# Altium schematic symbol library jlcpcb_2025_04_inductors_extended_0402.schlib: 1396 symbols (part 5 of 8) (continued)
## MLG1005S10NJT000
designator L?  Inductance: 10nH
Inductor, 10nH, ±5%, 220mΩ, 500mA, SMD 0402; Manufacturer: TDK; Manufacturer Part Number: MLG1005S10NJT000; Self-Resonant Frequency: 2.5GHz; Q Factor: 8@100MHz; Package Size: 0402; JLCPCB Basic Part: No; JLCPCB Part Number: C95044; Supplier 1: LCSC; Category: Inductors; Supplier Part Number 1: C95044; Tolerance: ±5%; Rated Current: 500mA; DC Resistance: 220mΩ; RoHS: Yes; ComponentLink1Description: Datasheet; ComponentLink1URL: https://wmsc.lcsc.com/wmsc/upload/file/pdf/v2/lcsc/2304140030_TDK-MLG1005S10NJT000_C95044.pdf; ComponentLink2Description: JLCPCB Part URL; ComponentLink2URL: https://jlcpcb.com/partdetail/C95044; ComponentLink3Description: LCSC Part URL; ComponentLink3URL: https://lcsc.com/product-detail/Inductors-SMD_TDK-TDK-MLG1005S10NJT000_C95044.html
footprint IND-0402 (0402 (1005M) Inductor)
pins: 1, 2

## MLG1005S10NJTD25
designator L?  Inductance: 10nH
Inductor, 10nH, ±5%, 220mΩ, 500mA, SMD 0402; Manufacturer: TDK; Manufacturer Part Number: MLG1005S10NJTD25; Self-Resonant Frequency: 3.4GHz; Q Factor: 8@100MHz; Package Size: 0402; JLCPCB Basic Part: No; JLCPCB Part Number: C524460; Supplier 1: LCSC; Category: Inductors; Supplier Part Number 1: C524460; Tolerance: ±5%; Rated Current: 500mA; DC Resistance: 220mΩ; RoHS: Yes; ComponentLink1Description: Datasheet; ComponentLink1URL: https://wmsc.lcsc.com/wmsc/upload/file/pdf/v2/lcsc/2304140030_TDK-MLG1005S10NJTD25_C524460.pdf; ComponentLink2Description: JLCPCB Part URL; ComponentLink2URL: https://jlcpcb.com/partdetail/C524460; ComponentLink3Description: LCSC Part URL; ComponentLink3URL: https://lcsc.com/product-detail/Inductors-SMD_TDK-TDK-MLG1005S10NJTD25_C524460.html
footprint IND-0402 (0402 (1005M) Inductor)
pins: 1, 2

## MLG1005S11NJT000
designator L?  Inductance: 11nH
Inductor, 11nH, ±5%, 280mΩ, 400mA, SMD 0402; Manufacturer: TDK; Manufacturer Part Number: MLG1005S11NJT000; Self-Resonant Frequency: 2.5GHz; Q Factor: 8@100MHz; Package Size: 0402; JLCPCB Basic Part: No; JLCPCB Part Number: C99148; Supplier 1: LCSC; Category: Inductors; Supplier Part Number 1: C99148; Tolerance: ±5%; Rated Current: 400mA; DC Resistance: 280mΩ; RoHS: Yes; ComponentLink1Description: Datasheet; ComponentLink1URL: https://wmsc.lcsc.com/wmsc/upload/file/pdf/v2/lcsc/2304140030_TDK-MLG1005S11NJT000_C99148.pdf; ComponentLink2Description: JLCPCB Part URL; ComponentLink2URL: https://jlcpcb.com/partdetail/C99148; ComponentLink3Description: LCSC Part URL; ComponentLink3URL: https://lcsc.com/product-detail/Inductors-SMD_TDK-TDK-MLG1005S11NJT000_C99148.html
footprint IND-0402 (0402 (1005M) Inductor)
pins: 1, 2

## MLG1005S12NHT000
designator L?  Inductance: 12nH
Inductor, 12nH, ±3%, 250mΩ, 400mA, SMD 0402; Manufacturer: TDK; Manufacturer Part Number: MLG1005S12NHT000; Self-Resonant Frequency: 2.5GHz; Q Factor: 8@100MHz; Package Size: 0402; JLCPCB Basic Part: No; JLCPCB Part Number: C275264; Supplier 1: LCSC; Category: Inductors; Supplier Part Number 1: C275264; Tolerance: ±3%; Rated Current: 400mA; DC Resistance: 250mΩ; RoHS: Yes; ComponentLink1Description: Datasheet; ComponentLink1URL: https://wmsc.lcsc.com/wmsc/upload/file/pdf/v2/lcsc/2304140030_TDK-MLG1005S12NHT000_C275264.pdf; ComponentLink2Description: JLCPCB Part URL; ComponentLink2URL: https://jlcpcb.com/partdetail/C275264; ComponentLink3Description: LCSC Part URL; ComponentLink3URL: https://lcsc.com/product-detail/Inductors-SMD_TDK-TDK-MLG1005S12NHT000_C275264.html
footprint IND-0402 (0402 (1005M) Inductor)
pins: 1, 2

## MLG1005S12NJT000
designator L?  Inductance: 12nH
Inductor, 12nH, ±5%, 250mΩ, 400mA, SMD 0402; Manufacturer: TDK; Manufacturer Part Number: MLG1005S12NJT000; Self-Resonant Frequency: 2.5GHz; Q Factor: 8@100MHz; Package Size: 0402; JLCPCB Basic Part: No; JLCPCB Part Number: C76762; Supplier 1: LCSC; Category: Inductors; Supplier Part Number 1: C76762; Tolerance: ±5%; Rated Current: 400mA; DC Resistance: 250mΩ; RoHS: Yes; ComponentLink1Description: Datasheet; ComponentLink1URL: https://wmsc.lcsc.com/wmsc/upload/file/pdf/v2/lcsc/2304140030_TDK-MLG1005S12NJT000_C76762.pdf; ComponentLink2Description: JLCPCB Part URL; ComponentLink2URL: https://jlcpcb.com/partdetail/C76762; ComponentLink3Description: LCSC Part URL; ComponentLink3URL: https://lcsc.com/product-detail/Inductors-SMD_TDK-TDK-MLG1005S12NJT000_C76762.html
footprint IND-0402 (0402 (1005M) Inductor)
pins: 1, 2

## MLG1005S12NJTD25
designator L?  Inductance: 12nH
Inductor, 12nH, ±5%, 250mΩ, 400mA, SMD 0402; Manufacturer: TDK; Manufacturer Part Number: MLG1005S12NJTD25; Self-Resonant Frequency: 2.5GHz; Q Factor: 8@100MHz; Package Size: 0402; JLCPCB Basic Part: No; JLCPCB Part Number: C433023; Supplier 1: LCSC; Category: Inductors; Supplier Part Number 1: C433023; Tolerance: ±5%; Rated Current: 400mA; DC Resistance: 250mΩ; RoHS: Yes; ComponentLink1Description: Datasheet; ComponentLink1URL: https://wmsc.lcsc.com/wmsc/upload/file/pdf/v2/lcsc/2304140030_TDK-MLG1005S12NJTD25_C433023.pdf; ComponentLink2Description: JLCPCB Part URL; ComponentLink2URL: https://jlcpcb.com/partdetail/C433023; ComponentLink3Description: LCSC Part URL; ComponentLink3URL: https://lcsc.com/product-detail/Inductors-SMD_TDK-TDK-MLG1005S12NJTD25_C433023.html
footprint IND-0402 (0402 (1005M) Inductor)
pins: 1, 2

## MLG1005S13NJT000
designator L?  Inductance: 13nH
Inductor, 13nH, ±5%, 260mΩ, 400mA, SMD 0402; Manufacturer: TDK; Manufacturer Part Number: MLG1005S13NJT000; Self-Resonant Frequency: 2.9GHz; Q Factor: 8@100MHz; Package Size: 0402; JLCPCB Basic Part: No; JLCPCB Part Number: C307720; Supplier 1: LCSC; Category: Inductors; Supplier Part Number 1: C307720; Tolerance: ±5%; Rated Current: 400mA; DC Resistance: 260mΩ; RoHS: Yes; ComponentLink1Description: Datasheet; ComponentLink1URL: https://wmsc.lcsc.com/wmsc/upload/file/pdf/v2/lcsc/1811081628_TDK-MLG1005S13NJT000_C307720.pdf; ComponentLink2Description: JLCPCB Part URL; ComponentLink2URL: https://jlcpcb.com/partdetail/C307720; ComponentLink3Description: LCSC Part URL; ComponentLink3URL: https://lcsc.com/product-detail/Inductors-SMD_TDK-TDK-MLG1005S13NJT000_C307720.html
footprint IND-0402 (0402 (1005M) Inductor)
pins: 1, 2

## MLG1005S15NHT000
designator L?  Inductance: 15nH
Inductor, 15nH, ±3%, 350mΩ, 400mA, SMD 0402; Manufacturer: TDK; Manufacturer Part Number: MLG1005S15NHT000; Self-Resonant Frequency: 2.2GHz; Q Factor: 8@100MHz; Package Size: 0402; JLCPCB Basic Part: No; JLCPCB Part Number: C502013; Supplier 1: LCSC; Category: Inductors; Supplier Part Number 1: C502013; Tolerance: ±3%; Rated Current: 400mA; DC Resistance: 350mΩ; RoHS: Yes; ComponentLink1Description: Datasheet; ComponentLink1URL: https://wmsc.lcsc.com/wmsc/upload/file/pdf/v2/lcsc/2304140030_TDK-MLG1005S15NHT000_C502013.pdf; ComponentLink2Description: JLCPCB Part URL; ComponentLink2URL: https://jlcpcb.com/partdetail/C502013; ComponentLink3Description: LCSC Part URL; ComponentLink3URL: https://lcsc.com/product-detail/Inductors-SMD_TDK-TDK-MLG1005S15NHT000_C502013.html
footprint IND-0402 (0402 (1005M) Inductor)
pins: 1, 2

## MLG1005S15NJT000
designator L?  Inductance: 15nH
Inductor, 15nH, ±5%, 350mΩ, 400mA, SMD 0402; Manufacturer: TDK; Manufacturer Part Number: MLG1005S15NJT000; Self-Resonant Frequency: 2.2GHz; Q Factor: 8@100MHz; Package Size: 0402; JLCPCB Basic Part: No; JLCPCB Part Number: C76763; Supplier 1: LCSC; Category: Inductors; Supplier Part Number 1: C76763; Tolerance: ±5%; Rated Current: 400mA; DC Resistance: 350mΩ; RoHS: Yes; ComponentLink1Description: Datasheet; ComponentLink1URL: https://wmsc.lcsc.com/wmsc/upload/file/pdf/v2/lcsc/2304140030_TDK-MLG1005S15NJT000_C76763.pdf; ComponentLink2Description: JLCPCB Part URL; ComponentLink2URL: https://jlcpcb.com/partdetail/C76763; ComponentLink3Description: LCSC Part URL; ComponentLink3URL: https://lcsc.com/product-detail/Inductors-SMD_TDK-TDK-MLG1005S15NJT000_C76763.html
footprint IND-0402 (0402 (1005M) Inductor)
pins: 1, 2

## MLG1005S15NJTD25
designator L?  Inductance: 15nH
Inductor, 15nH, ±5%, 350mΩ, 400mA, SMD 0402; Manufacturer: TDK; Manufacturer Part Number: MLG1005S15NJTD25; Self-Resonant Frequency: 2.2GHz; Q Factor: 8@100MHz; Package Size: 0402; JLCPCB Basic Part: No; JLCPCB Part Number: C307721; Supplier 1: LCSC; Category: Inductors; Supplier Part Number 1: C307721; Tolerance: ±5%; Rated Current: 400mA; DC Resistance: 350mΩ; RoHS: Yes; ComponentLink1Description: Datasheet; ComponentLink1URL: https://wmsc.lcsc.com/wmsc/upload/file/pdf/v2/lcsc/2304140030_TDK-MLG1005S15NJTD25_C307721.pdf; ComponentLink2Description: JLCPCB Part URL; ComponentLink2URL: https://jlcpcb.com/partdetail/C307721; ComponentLink3Description: LCSC Part URL; ComponentLink3URL: https://lcsc.com/product-detail/Inductors-SMD_TDK-TDK-MLG1005S15NJTD25_C307721.html
footprint IND-0402 (0402 (1005M) Inductor)
pins: 1, 2

## MLG1005S18NHT000
designator L?  Inductance: 18nH
Inductor, 18nH, ±3%, 400mΩ, 350mA, SMD 0402; Manufacturer: TDK; Manufacturer Part Number: MLG1005S18NHT000; Self-Resonant Frequency: 2.5GHz; Q Factor: 8@100MHz; Package Size: 0402; JLCPCB Basic Part: No; JLCPCB Part Number: C880701; Supplier 1: LCSC; Category: Inductors; Supplier Part Number 1: C880701; Tolerance: ±3%; Rated Current: 350mA; DC Resistance: 400mΩ; RoHS: Yes; ComponentLink1Description: Datasheet; ComponentLink1URL: https://wmsc.lcsc.com/wmsc/upload/file/pdf/v2/lcsc/2304140030_TDK-MLG1005S18NHT000_C880701.pdf; ComponentLink2Description: JLCPCB Part URL; ComponentLink2URL: https://jlcpcb.com/partdetail/C880701; ComponentLink3Description: LCSC Part URL; ComponentLink3URL: https://lcsc.com/product-detail/Inductors-SMD_TDK-TDK-MLG1005S18NHT000_C880701.html
footprint IND-0402 (0402 (1005M) Inductor)
pins: 1, 2

## MLG1005S18NJT000
designator L?  Inductance: 18nH
Inductor, 18nH, ±5%, 400mΩ, 350mA, SMD 0402; Manufacturer: TDK; Manufacturer Part Number: MLG1005S18NJT000; Self-Resonant Frequency: 2GHz; Q Factor: 8@100MHz; Package Size: 0402; JLCPCB Basic Part: No; JLCPCB Part Number: C76764; Supplier 1: LCSC; Category: Inductors; Supplier Part Number 1: C76764; Tolerance: ±5%; Rated Current: 350mA; DC Resistance: 400mΩ; RoHS: Yes; ComponentLink1Description: Datasheet; ComponentLink1URL: https://wmsc.lcsc.com/wmsc/upload/file/pdf/v2/lcsc/2304140030_TDK-MLG1005S18NJT000_C76764.pdf; ComponentLink2Description: JLCPCB Part URL; ComponentLink2URL: https://jlcpcb.com/partdetail/C76764; ComponentLink3Description: LCSC Part URL; ComponentLink3URL: https://lcsc.com/product-detail/Inductors-SMD_TDK-TDK-MLG1005S18NJT000_C76764.html
footprint IND-0402 (0402 (1005M) Inductor)
pins: 1, 2

## MLG1005S22NHTD25
designator L?  Inductance: 22nH
Inductor, 22nH, ±3%, 460mΩ, 350mA, SMD 0402; Manufacturer: TDK; Manufacturer Part Number: MLG1005S22NHTD25; Self-Resonant Frequency: 2.2GHz; Q Factor: 8@100MHz; Package Size: 0402; JLCPCB Basic Part: No; JLCPCB Part Number: C404640; Supplier 1: LCSC; Category: Inductors; Supplier Part Number 1: C404640; Tolerance: ±3%; Rated Current: 350mA; DC Resistance: 460mΩ; RoHS: Yes; ComponentLink1Description: Datasheet; ComponentLink1URL: https://wmsc.lcsc.com/wmsc/upload/file/pdf/v2/lcsc/2304140030_TDK-MLG1005S22NHTD25_C404640.pdf; ComponentLink2Description: JLCPCB Part URL; ComponentLink2URL: https://jlcpcb.com/partdetail/C404640; ComponentLink3Description: LCSC Part URL; ComponentLink3URL: https://lcsc.com/product-detail/Inductors-SMD_TDK-TDK-MLG1005S22NHTD25_C404640.html
footprint IND-0402 (0402 (1005M) Inductor)
pins: 1, 2

## MLG1005S22NJT000
designator L?  Inductance: 22nH
Inductor, 22nH, ±5%, 460mΩ, 350mA, SMD 0402; Manufacturer: TDK; Manufacturer Part Number: MLG1005S22NJT000; Self-Resonant Frequency: 2.2GHz; Q Factor: 8@100MHz; Package Size: 0402; JLCPCB Basic Part: No; JLCPCB Part Number: C76768; Supplier 1: LCSC; Category: Inductors; Supplier Part Number 1: C76768; Tolerance: ±5%; Rated Current: 350mA; DC Resistance: 460mΩ; RoHS: Yes; ComponentLink1Description: Datasheet; ComponentLink1URL: https://wmsc.lcsc.com/wmsc/upload/file/pdf/v2/lcsc/2304140030_TDK-MLG1005S22NJT000_C76768.pdf; ComponentLink2Description: JLCPCB Part URL; ComponentLink2URL: https://jlcpcb.com/partdetail/C76768; ComponentLink3Description: LCSC Part URL; ComponentLink3URL: https://lcsc.com/product-detail/Inductors-SMD_TDK-TDK-MLG1005S22NJT000_C76768.html
footprint IND-0402 (0402 (1005M) Inductor)
pins: 1, 2

## MLG1005S24NHT000
designator L?  Inductance: 24nH
Inductor, 24nH, ±3%, 430mΩ, 350mA, SMD 0402; Manufacturer: TDK; Manufacturer Part Number: MLG1005S24NHT000; Self-Resonant Frequency: 2.1GHz; Q Factor: 8@100MHz; Package Size: 0402; JLCPCB Basic Part: No; JLCPCB Part Number: C275275; Supplier 1: LCSC; Category: Inductors; Supplier Part Number 1: C275275; Tolerance: ±3%; Rated Current: 350mA; DC Resistance: 430mΩ; RoHS: Yes; ComponentLink1Description: Datasheet; ComponentLink1URL: https://wmsc.lcsc.com/wmsc/upload/file/pdf/v2/lcsc/2304140030_TDK-MLG1005S24NHT000_C275275.pdf; ComponentLink2Description: JLCPCB Part URL; ComponentLink2URL: https://jlcpcb.com/partdetail/C275275; ComponentLink3Description: LCSC Part URL; ComponentLink3URL: https://lcsc.com/product-detail/Inductors-SMD_TDK-TDK-MLG1005S24NHT000_C275275.html
footprint IND-0402 (0402 (1005M) Inductor)
pins: 1, 2

## MLG1005S24NHTD25
designator L?  Inductance: 24nH
Inductor, 24nH, ±3%, 430mΩ, 350mA, SMD 0402; Manufacturer: TDK; Manufacturer Part Number: MLG1005S24NHTD25; Self-Resonant Frequency: 1.7GHz; Q Factor: 8@100MHz; Package Size: 0402; JLCPCB Basic Part: No; JLCPCB Part Number: C404641; Supplier 1: LCSC; Category: Inductors; Supplier Part Number 1: C404641; Tolerance: ±3%; Rated Current: 350mA; DC Resistance: 430mΩ; RoHS: Yes; ComponentLink1Description: Datasheet; ComponentLink1URL: https://wmsc.lcsc.com/wmsc/upload/file/pdf/v2/lcsc/2304140030_TDK-MLG1005S24NHTD25_C404641.pdf; ComponentLink2Description: JLCPCB Part URL; ComponentLink2URL: https://jlcpcb.com/partdetail/C404641; ComponentLink3Description: LCSC Part URL; ComponentLink3URL: https://lcsc.com/product-detail/Inductors-SMD_TDK-TDK-MLG1005S24NHTD25_C404641.html
footprint IND-0402 (0402 (1005M) Inductor)
pins: 1, 2

## MLG1005S24NJT000
designator L?  Inductance: 24nH
Inductor, 24nH, ±5%, 430mΩ, 350mA, SMD 0402; Manufacturer: TDK; Manufacturer Part Number: MLG1005S24NJT000; Self-Resonant Frequency: 1.7GHz; Q Factor: 8@100MHz; Package Size: 0402; JLCPCB Basic Part: No; JLCPCB Part Number: C516790; Supplier 1: LCSC; Category: Inductors; Supplier Part Number 1: C516790; Tolerance: ±5%; Rated Current: 350mA; DC Resistance: 430mΩ; RoHS: Yes; ComponentLink1Description: Datasheet; ComponentLink1URL: https://wmsc.lcsc.com/wmsc/upload/file/pdf/v2/lcsc/2304140030_TDK-MLG1005S24NJT000_C516790.pdf; ComponentLink2Description: JLCPCB Part URL; ComponentLink2URL: https://jlcpcb.com/partdetail/C516790; ComponentLink3Description: LCSC Part URL; ComponentLink3URL: https://lcsc.com/product-detail/Inductors-SMD_TDK-TDK-MLG1005S24NJT000_C516790.html
footprint IND-0402 (0402 (1005M) Inductor)
pins: 1, 2

## MLG1005S27NHT000
designator L?  Inductance: 27nH
Inductor, 27nH, ±3%, 530mΩ, 300mA, SMD 0402; Manufacturer: TDK; Manufacturer Part Number: MLG1005S27NHT000; Self-Resonant Frequency: 2GHz; Q Factor: 8@100MHz; Package Size: 0402; JLCPCB Basic Part: No; JLCPCB Part Number: C275278; Supplier 1: LCSC; Category: Inductors; Supplier Part Number 1: C275278; Tolerance: ±3%; Rated Current: 300mA; DC Resistance: 530mΩ; RoHS: Yes; ComponentLink1Description: Datasheet; ComponentLink1URL: https://wmsc.lcsc.com/wmsc/upload/file/pdf/v2/lcsc/2304140030_TDK-MLG1005S27NHT000_C275278.pdf; ComponentLink2Description: JLCPCB Part URL; ComponentLink2URL: https://jlcpcb.com/partdetail/C275278; ComponentLink3Description: LCSC Part URL; ComponentLink3URL: https://lcsc.com/product-detail/Inductors-SMD_TDK-TDK-MLG1005S27NHT000_C275278.html
footprint IND-0402 (0402 (1005M) Inductor)
pins: 1, 2

## MLG1005S27NJT000
designator L?  Inductance: 27nH
Inductor, 27nH, ±5%, 530mΩ, 300mA, SMD 0402; Manufacturer: TDK; Manufacturer Part Number: MLG1005S27NJT000; Self-Resonant Frequency: 1.6GHz; Q Factor: 8@100MHz; Package Size: 0402; JLCPCB Basic Part: No; JLCPCB Part Number: C98759; Supplier 1: LCSC; Category: Inductors; Supplier Part Number 1: C98759; Tolerance: ±5%; Rated Current: 300mA; DC Resistance: 530mΩ; RoHS: Yes; ComponentLink1Description: Datasheet; ComponentLink1URL: https://wmsc.lcsc.com/wmsc/upload/file/pdf/v2/lcsc/2304140030_TDK-MLG1005S27NJT000_C98759.pdf; ComponentLink2Description: JLCPCB Part URL; ComponentLink2URL: https://jlcpcb.com/partdetail/C98759; ComponentLink3Description: LCSC Part URL; ComponentLink3URL: https://lcsc.com/product-detail/Inductors-SMD_TDK-TDK-MLG1005S27NJT000_C98759.html
footprint IND-0402 (0402 (1005M) Inductor)
pins: 1, 2

## MLG1005S30NJT000
designator L?  Inductance: 30nH
Inductor, 30nH, ±5%, 500mΩ, 300mA, SMD 0402; Manufacturer: TDK; Manufacturer Part Number: MLG1005S30NJT000; Self-Resonant Frequency: 1.9GHz; Q Factor: 8@100MHz; Package Size: 0402; JLCPCB Basic Part: No; JLCPCB Part Number: C76771; Supplier 1: LCSC; Category: Inductors; Supplier Part Number 1: C76771; Tolerance: ±5%; Rated Current: 300mA; DC Resistance: 500mΩ; RoHS: Yes; ComponentLink1Description: Datasheet; ComponentLink1URL: https://wmsc.lcsc.com/wmsc/upload/file/pdf/v2/lcsc/2304140030_TDK-MLG1005S30NJT000_C76771.pdf; ComponentLink2Description: JLCPCB Part URL; ComponentLink2URL: https://jlcpcb.com/partdetail/C76771; ComponentLink3Description: LCSC Part URL; ComponentLink3URL: https://lcsc.com/product-detail/Inductors-SMD_TDK-TDK-MLG1005S30NJT000_C76771.html
footprint IND-0402 (0402 (1005M) Inductor)
pins: 1, 2

## MLG1005S33NHTD25
designator L?  Inductance: 33nH
Inductor, 33nH, ±3%, 590mΩ, 300mA, SMD 0402; Manufacturer: TDK; Manufacturer Part Number: MLG1005S33NHTD25; Self-Resonant Frequency: 1.8GHz; Q Factor: 8@100MHz; Package Size: 0402; JLCPCB Basic Part: No; JLCPCB Part Number: C404644; Supplier 1: LCSC; Category: Inductors; Supplier Part Number 1: C404644; Tolerance: ±3%; Rated Current: 300mA; DC Resistance: 590mΩ; RoHS: Yes; ComponentLink1Description: Datasheet; ComponentLink1URL: https://wmsc.lcsc.com/wmsc/upload/file/pdf/v2/lcsc/2304140030_TDK-MLG1005S33NHTD25_C404644.pdf; ComponentLink2Description: JLCPCB Part URL; ComponentLink2URL: https://jlcpcb.com/partdetail/C404644; ComponentLink3Description: LCSC Part URL; ComponentLink3URL: https://lcsc.com/product-detail/Inductors-SMD_TDK-TDK-MLG1005S33NHTD25_C404644.html
footprint IND-0402 (0402 (1005M) Inductor)
pins: 1, 2

## MLG1005S33NJT000
designator L?  Inductance: 33nH
Inductor, 33nH, ±5%, 590mΩ, 300mA, SMD 0402; Manufacturer: TDK; Manufacturer Part Number: MLG1005S33NJT000; Self-Resonant Frequency: 1.4GHz; Q Factor: 8@100MHz; Package Size: 0402; JLCPCB Basic Part: No; JLCPCB Part Number: C76772; Supplier 1: LCSC; Category: Inductors; Supplier Part Number 1: C76772; Tolerance: ±5%; Rated Current: 300mA; DC Resistance: 590mΩ; RoHS: Yes; ComponentLink1Description: Datasheet; ComponentLink1URL: https://wmsc.lcsc.com/wmsc/upload/file/pdf/v2/lcsc/2304140030_TDK-MLG1005S33NJT000_C76772.pdf; ComponentLink2Description: JLCPCB Part URL; ComponentLink2URL: https://jlcpcb.com/partdetail/C76772; ComponentLink3Description: LCSC Part URL; ComponentLink3URL: https://lcsc.com/product-detail/Inductors-SMD_TDK-TDK-MLG1005S33NJT000_C76772.html
footprint IND-0402 (0402 (1005M) Inductor)
pins: 1, 2

## MLG1005S33NJTD25
designator L?  Inductance: 33nH
Inductor, 33nH, ±5%, 590mΩ, 300mA, SMD 0402; Manufacturer: TDK; Manufacturer Part Number: MLG1005S33NJTD25; Self-Resonant Frequency: 1.4GHz; Q Factor: 8@100MHz; Package Size: 0402; JLCPCB Basic Part: No; JLCPCB Part Number: C2042247; Supplier 1: LCSC; Category: Inductors; Supplier Part Number 1: C2042247; Tolerance: ±5%; Rated Current: 300mA; DC Resistance: 590mΩ; RoHS: Yes; ComponentLink1Description: Datasheet; ComponentLink1URL: https://wmsc.lcsc.com/wmsc/upload/file/pdf/v2/lcsc/2304140030_TDK-MLG1005S33NJTD25_C2042247.pdf; ComponentLink2Description: JLCPCB Part URL; ComponentLink2URL: https://jlcpcb.com/partdetail/C2042247; ComponentLink3Description: LCSC Part URL; ComponentLink3URL: https://lcsc.com/product-detail/Inductors-SMD_TDK-TDK-MLG1005S33NJTD25_C2042247.html
footprint IND-0402 (0402 (1005M) Inductor)
pins: 1, 2

## MLG1005S36NJT000
designator L?  Inductance: 36nH
Inductor, 36nH, ±5%, 620mΩ, 250mA, SMD 0402; Manufacturer: TDK; Manufacturer Part Number: MLG1005S36NJT000; Self-Resonant Frequency: 1.7GHz; Q Factor: 8@100MHz; Package Size: 0402; JLCPCB Basic Part: No; JLCPCB Part Number: C518884; Supplier 1: LCSC; Category: Inductors; Supplier Part Number 1: C518884; Tolerance: ±5%; Rated Current: 250mA; DC Resistance: 620mΩ; RoHS: Yes; ComponentLink1Description: Datasheet; ComponentLink1URL: https://wmsc.lcsc.com/wmsc/upload/file/pdf/v2/lcsc/2005112103_TDK-MLG1005S36NJT000_C518884.pdf; ComponentLink2Description: JLCPCB Part URL; ComponentLink2URL: https://jlcpcb.com/partdetail/C518884; ComponentLink3Description: LCSC Part URL; ComponentLink3URL: https://lcsc.com/product-detail/Inductors-SMD_TDK-TDK-MLG1005S36NJT000_C518884.html
footprint IND-0402 (0402 (1005M) Inductor)
pins: 1, 2

## MLG1005S36NJTD25
designator L?  Inductance: 36nH
Inductor, 36nH, ±5%, 620mΩ, 250mA, SMD 0402; Manufacturer: TDK; Manufacturer Part Number: MLG1005S36NJTD25; Self-Resonant Frequency: 1.3GHz; Q Factor: 8@100MHz; Package Size: 0402; JLCPCB Basic Part: No; JLCPCB Part Number: C2046147; Supplier 1: LCSC; Category: Inductors; Supplier Part Number 1: C2046147; Tolerance: ±5%; Rated Current: 250mA; DC Resistance: 620mΩ; RoHS: Yes; ComponentLink1Description: Datasheet; ComponentLink1URL: https://wmsc.lcsc.com/wmsc/upload/file/pdf/v2/lcsc/2304140030_TDK-MLG1005S36NJTD25_C2046147.pdf; ComponentLink2Description: JLCPCB Part URL; ComponentLink2URL: https://jlcpcb.com/partdetail/C2046147; ComponentLink3Description: LCSC Part URL; ComponentLink3URL: https://lcsc.com/product-detail/Inductors-SMD_TDK-TDK-MLG1005S36NJTD25_C2046147.html
footprint IND-0402 (0402 (1005M) Inductor)
pins: 1, 2

## MLG1005S39NJT000
designator L?  Inductance: 39nH
Inductor, 39nH, ±5%, 650mΩ, 250mA, SMD 0402; Manufacturer: TDK; Manufacturer Part Number: MLG1005S39NJT000; Self-Resonant Frequency: 1.2GHz; Q Factor: 8@100MHz; Package Size: 0402; JLCPCB Basic Part: No; JLCPCB Part Number: C87531; Supplier 1: LCSC; Category: Inductors; Supplier Part Number 1: C87531; Tolerance: ±5%; Rated Current: 250mA; DC Resistance: 650mΩ; RoHS: Yes; ComponentLink1Description: Datasheet; ComponentLink1URL: https://wmsc.lcsc.com/wmsc/upload/file/pdf/v2/lcsc/2304140030_TDK-MLG1005S39NJT000_C87531.pdf; ComponentLink2Description: JLCPCB Part URL; ComponentLink2URL: https://jlcpcb.com/partdetail/C87531; ComponentLink3Description: LCSC Part URL; ComponentLink3URL: https://lcsc.com/product-detail/Inductors-SMD_TDK-TDK-MLG1005S39NJT000_C87531.html
footprint IND-0402 (0402 (1005M) Inductor)
pins: 1, 2

## MLG1005S39NJTD25
designator L?  Inductance: 39nH
Inductor, 39nH, ±5%, 650mΩ, 250mA, SMD 0402; Manufacturer: TDK; Manufacturer Part Number: MLG1005S39NJTD25; Self-Resonant Frequency: 1.2GHz; Q Factor: 8@100MHz; Package Size: 0402; JLCPCB Basic Part: No; JLCPCB Part Number: C307725; Supplier 1: LCSC; Category: Inductors; Supplier Part Number 1: C307725; Tolerance: ±5%; Rated Current: 250mA; DC Resistance: 650mΩ; RoHS: Yes; ComponentLink1Description: Datasheet; ComponentLink1URL: https://wmsc.lcsc.com/wmsc/upload/file/pdf/v2/lcsc/2304140030_TDK-MLG1005S39NJTD25_C307725.pdf; ComponentLink2Description: JLCPCB Part URL; ComponentLink2URL: https://jlcpcb.com/partdetail/C307725; ComponentLink3Description: LCSC Part URL; ComponentLink3URL: https://lcsc.com/product-detail/Inductors-SMD_TDK-TDK-MLG1005S39NJTD25_C307725.html
footprint IND-0402 (0402 (1005M) Inductor)
pins: 1, 2

## MLG1005S43NJTD25
designator L?  Inductance: 43nH
Inductor, 43nH, ±5%, 670mΩ, 250mA, SMD 0402; Manufacturer: TDK; Manufacturer Part Number: MLG1005S43NJTD25; Self-Resonant Frequency: 1.6GHz; Q Factor: 8@100MHz; Package Size: 0402; JLCPCB Basic Part: No; JLCPCB Part Number: C2042359; Supplier 1: LCSC; Category: Inductors; Supplier Part Number 1: C2042359; Tolerance: ±5%; Rated Current: 250mA; DC Resistance: 670mΩ; RoHS: Yes; ComponentLink1Description: Datasheet; ComponentLink1URL: https://wmsc.lcsc.com/wmsc/upload/file/pdf/v2/lcsc/2304140030_TDK-MLG1005S43NJTD25_C2042359.pdf; ComponentLink2Description: JLCPCB Part URL; ComponentLink2URL: https://jlcpcb.com/partdetail/C2042359; ComponentLink3Description: LCSC Part URL; ComponentLink3URL: https://lcsc.com/product-detail/Inductors-SMD_TDK-TDK-MLG1005S43NJTD25_C2042359.html
footprint IND-0402 (0402 (1005M) Inductor)
pins: 1, 2

## MLG1005S47NJT000
designator L?  Inductance: 47nH
Inductor, 47nH, ±5%, 750mΩ, 250mA, SMD 0402; Manufacturer: TDK; Manufacturer Part Number: MLG1005S47NJT000; Self-Resonant Frequency: 1.1GHz; Q Factor: 8@100MHz; Package Size: 0402; JLCPCB Basic Part: No; JLCPCB Part Number: C76776; Supplier 1: LCSC; Category: Inductors; Supplier Part Number 1: C76776; Tolerance: ±5%; Rated Current: 250mA; DC Resistance: 750mΩ; RoHS: Yes; ComponentLink1Description: Datasheet; ComponentLink1URL: https://wmsc.lcsc.com/wmsc/upload/file/pdf/v2/lcsc/2304140030_TDK-MLG1005S47NJT000_C76776.pdf; ComponentLink2Description: JLCPCB Part URL; ComponentLink2URL: https://jlcpcb.com/partdetail/C76776; ComponentLink3Description: LCSC Part URL; ComponentLink3URL: https://lcsc.com/product-detail/Inductors-SMD_TDK-TDK-MLG1005S47NJT000_C76776.html
footprint IND-0402 (0402 (1005M) Inductor)
pins: 1, 2

## MLG1005S47NJTD25
designator L?  Inductance: 47nH
Inductor, 47nH, ±5%, 750mΩ, 250mA, SMD 0402; Manufacturer: TDK; Manufacturer Part Number: MLG1005S47NJTD25; Self-Resonant Frequency: 1.1GHz; Q Factor: 8@100MHz; Package Size: 0402; JLCPCB Basic Part: No; JLCPCB Part Number: C307727; Supplier 1: LCSC; Category: Inductors; Supplier Part Number 1: C307727; Tolerance: ±5%; Rated Current: 250mA; DC Resistance: 750mΩ; RoHS: Yes; ComponentLink1Description: Datasheet; ComponentLink1URL: https://wmsc.lcsc.com/wmsc/upload/file/pdf/v2/lcsc/2304140030_TDK-MLG1005S47NJTD25_C307727.pdf; ComponentLink2Description: JLCPCB Part URL; ComponentLink2URL: https://jlcpcb.com/partdetail/C307727; ComponentLink3Description: LCSC Part URL; ComponentLink3URL: https://lcsc.com/product-detail/Inductors-SMD_TDK-TDK-MLG1005S47NJTD25_C307727.html
footprint IND-0402 (0402 (1005M) Inductor)
pins: 1, 2

## MLG1005S51NJTD25
designator L?  Inductance: 51nH
Inductor, 51nH, ±5%, 720mΩ, 250mA, SMD 0402; Manufacturer: TDK; Manufacturer Part Number: MLG1005S51NJTD25; Self-Resonant Frequency: 1.5GHz; Q Factor: 8@100MHz; Package Size: 0402; JLCPCB Basic Part: No; JLCPCB Part Number: C1329469; Supplier 1: LCSC; Category: Inductors; Supplier Part Number 1: C1329469; Tolerance: ±5%; Rated Current: 250mA; DC Resistance: 720mΩ; RoHS: Yes; ComponentLink1Description: Datasheet; ComponentLink1URL: https://wmsc.lcsc.com/wmsc/upload/file/pdf/v2/lcsc/2304140030_TDK-MLG1005S51NJTD25_C1329469.pdf; ComponentLink2Description: JLCPCB Part URL; ComponentLink2URL: https://jlcpcb.com/partdetail/C1329469; ComponentLink3Description: LCSC Part URL; ComponentLink3URL: https://lcsc.com/product-detail/Inductors-SMD_TDK-TDK-MLG1005S51NJTD25_C1329469.html
footprint IND-0402 (0402 (1005M) Inductor)
pins: 1, 2

## MLG1005S56NJT000
designator L?  Inductance: 56nH
Inductor, 56nH, ±5%, 830mΩ, 200mA, SMD 0402; Manufacturer: TDK; Manufacturer Part Number: MLG1005S56NJT000; Self-Resonant Frequency: 1GHz; Q Factor: 8@100MHz; Package Size: 0402; JLCPCB Basic Part: No; JLCPCB Part Number: C76777; Supplier 1: LCSC; Category: Inductors; Supplier Part Number 1: C76777; Tolerance: ±5%; Rated Current: 200mA; DC Resistance: 830mΩ; RoHS: Yes; ComponentLink1Description: Datasheet; ComponentLink1URL: https://wmsc.lcsc.com/wmsc/upload/file/pdf/v2/lcsc/2304140030_TDK-MLG1005S56NJT000_C76777.pdf; ComponentLink2Description: JLCPCB Part URL; ComponentLink2URL: https://jlcpcb.com/partdetail/C76777; ComponentLink3Description: LCSC Part URL; ComponentLink3URL: https://lcsc.com/product-detail/Inductors-SMD_TDK-TDK-MLG1005S56NJT000_C76777.html
footprint IND-0402 (0402 (1005M) Inductor)
pins: 1, 2

## MLG1005S68NHTD25
designator L?  Inductance: 68nH
Inductor, 68nH, ±3%, 870mΩ, 200mA, SMD 0402; Manufacturer: TDK; Manufacturer Part Number: MLG1005S68NHTD25; Self-Resonant Frequency: 1.1GHz; Q Factor: 8@100MHz; Package Size: 0402; JLCPCB Basic Part: No; JLCPCB Part Number: C404652; Supplier 1: LCSC; Category: Inductors; Supplier Part Number 1: C404652; Tolerance: ±3%; Rated Current: 200mA; DC Resistance: 870mΩ; RoHS: Yes; ComponentLink1Description: Datasheet; ComponentLink1URL: https://wmsc.lcsc.com/wmsc/upload/file/pdf/v2/lcsc/2304140030_TDK-MLG1005S68NHTD25_C404652.pdf; ComponentLink2Description: JLCPCB Part URL; ComponentLink2URL: https://jlcpcb.com/partdetail/C404652; ComponentLink3Description: LCSC Part URL; ComponentLink3URL: https://lcsc.com/product-detail/Inductors-SMD_TDK-TDK-MLG1005S68NHTD25_C404652.html
footprint IND-0402 (0402 (1005M) Inductor)
pins: 1, 2

## MLG1005S68NJT000
designator L?  Inductance: 68nH
Inductor, 68nH, ±5%, 870mΩ, 200mA, SMD 0402; Manufacturer: TDK; Manufacturer Part Number: MLG1005S68NJT000; Self-Resonant Frequency: 800MHz; Q Factor: 8@100MHz; Package Size: 0402; JLCPCB Basic Part: No; JLCPCB Part Number: C87533; Supplier 1: LCSC; Category: Inductors; Supplier Part Number 1: C87533; Tolerance: ±5%; Rated Current: 200mA; DC Resistance: 870mΩ; RoHS: Yes; ComponentLink1Description: Datasheet; ComponentLink1URL: https://wmsc.lcsc.com/wmsc/upload/file/pdf/v2/lcsc/2304140030_TDK-MLG1005S68NJT000_C87533.pdf; ComponentLink2Description: JLCPCB Part URL; ComponentLink2URL: https://jlcpcb.com/partdetail/C87533; ComponentLink3Description: LCSC Part URL; ComponentLink3URL: https://lcsc.com/product-detail/Inductors-SMD_TDK-TDK-MLG1005S68NJT000_C87533.html
footprint IND-0402 (0402 (1005M) Inductor)
pins: 1, 2

## MLG1005S75NHTD25
designator L?  Inductance: 75nH
Inductor, 75nH, ±3%, 930mΩ, 200mA, SMD 0402; Manufacturer: TDK; Manufacturer Part Number: MLG1005S75NHTD25; Self-Resonant Frequency: 1.1GHz; Q Factor: 8@100MHz; Package Size: 0402; JLCPCB Basic Part: No; JLCPCB Part Number: C404653; Supplier 1: LCSC; Category: Inductors; Supplier Part Number 1: C404653; Tolerance: ±3%; Rated Current: 200mA; DC Resistance: 930mΩ; RoHS: Yes; ComponentLink1Description: Datasheet; ComponentLink1URL: https://wmsc.lcsc.com/wmsc/upload/file/pdf/v2/lcsc/2304140030_TDK-MLG1005S75NHTD25_C404653.pdf; ComponentLink2Description: JLCPCB Part URL; ComponentLink2URL: https://jlcpcb.com/partdetail/C404653; ComponentLink3Description: LCSC Part URL; ComponentLink3URL: https://lcsc.com/product-detail/Inductors-SMD_TDK-TDK-MLG1005S75NHTD25_C404653.html
footprint IND-0402 (0402 (1005M) Inductor)
pins: 1, 2

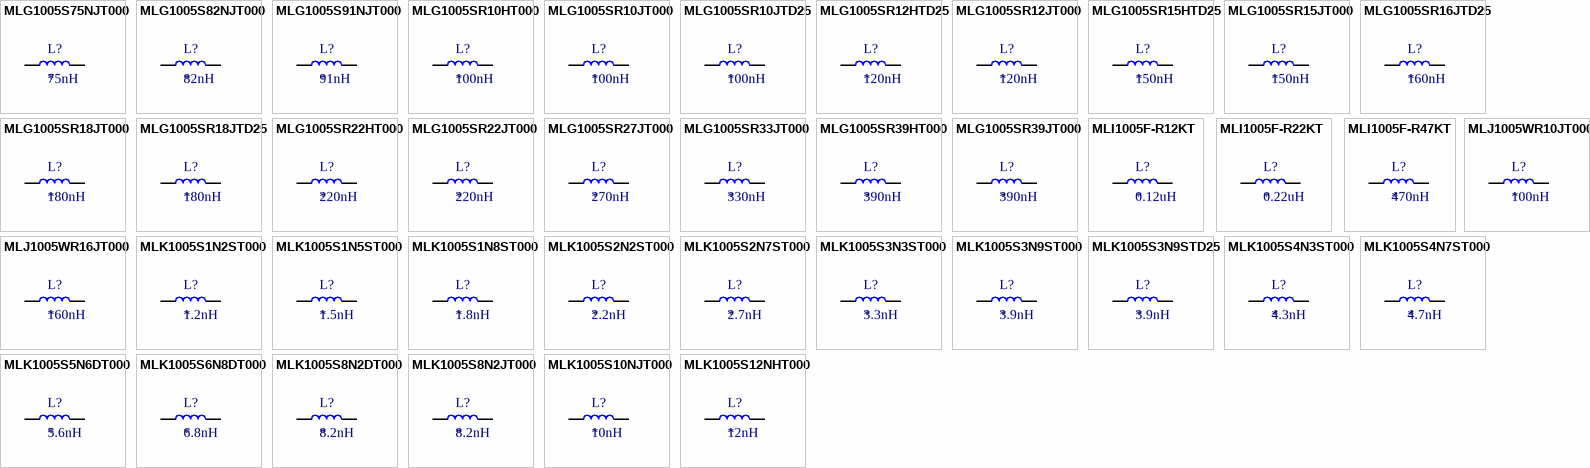
[diagram p22: symbols MLG1005S75NJT000 to MLK1005S12NHT000]

## MLG1005S75NJT000
designator L?  Inductance: 75nH
Inductor, 75nH, ±5%, 930mΩ, 200mA, SMD 0402; Manufacturer: TDK; Manufacturer Part Number: MLG1005S75NJT000; Self-Resonant Frequency: 750MHz; Q Factor: 8@100MHz; Package Size: 0402; JLCPCB Basic Part: No; JLCPCB Part Number: C880710; Supplier 1: LCSC; Category: Inductors; Supplier Part Number 1: C880710; Tolerance: ±5%; Rated Current: 200mA; DC Resistance: 930mΩ; RoHS: Yes; ComponentLink1Description: Datasheet; ComponentLink1URL: https://wmsc.lcsc.com/wmsc/upload/file/pdf/v2/lcsc/2010170835_TDK-MLG1005S75NJT000_C880710.pdf; ComponentLink2Description: JLCPCB Part URL; ComponentLink2URL: https://jlcpcb.com/partdetail/C880710; ComponentLink3Description: LCSC Part URL; ComponentLink3URL: https://lcsc.com/product-detail/Inductors-SMD_TDK-TDK-MLG1005S75NJT000_C880710.html
footprint IND-0402 (0402 (1005M) Inductor)
pins: 1, 2

## MLG1005S82NJT000
designator L?  Inductance: 82nH
Inductor, 82nH, ±5%, 1.01Ω, 200mA, SMD 0402; Manufacturer: TDK; Manufacturer Part Number: MLG1005S82NJT000; Self-Resonant Frequency: 700MHz; Q Factor: 8@100MHz; Package Size: 0402; JLCPCB Basic Part: No; JLCPCB Part Number: C275301; Supplier 1: LCSC; Category: Inductors; Supplier Part Number 1: C275301; Tolerance: ±5%; Rated Current: 200mA; DC Resistance: 1.01Ω; RoHS: Yes; ComponentLink1Description: Datasheet; ComponentLink1URL: https://wmsc.lcsc.com/wmsc/upload/file/pdf/v2/lcsc/2304140030_TDK-MLG1005S82NJT000_C275301.pdf; ComponentLink2Description: JLCPCB Part URL; ComponentLink2URL: https://jlcpcb.com/partdetail/C275301; ComponentLink3Description: LCSC Part URL; ComponentLink3URL: https://lcsc.com/product-detail/Inductors-SMD_TDK-TDK-MLG1005S82NJT000_C275301.html
footprint IND-0402 (0402 (1005M) Inductor)
pins: 1, 2

## MLG1005S91NJT000
designator L?  Inductance: 91nH
Inductor, 91nH, ±5%, 1.14Ω, 200mA, SMD 0402; Manufacturer: TDK; Manufacturer Part Number: MLG1005S91NJT000; Self-Resonant Frequency: 900MHz; Q Factor: 8@100MHz; Package Size: 0402; JLCPCB Basic Part: No; JLCPCB Part Number: C275303; Supplier 1: LCSC; Category: Inductors; Supplier Part Number 1: C275303; Tolerance: ±5%; Rated Current: 200mA; DC Resistance: 1.14Ω; RoHS: Yes; ComponentLink1Description: Datasheet; ComponentLink1URL: https://wmsc.lcsc.com/wmsc/upload/file/pdf/v2/lcsc/2304140030_TDK-MLG1005S91NJT000_C275303.pdf; ComponentLink2Description: JLCPCB Part URL; ComponentLink2URL: https://jlcpcb.com/partdetail/C275303; ComponentLink3Description: LCSC Part URL; ComponentLink3URL: https://lcsc.com/product-detail/Inductors-SMD_TDK-TDK-MLG1005S91NJT000_C275303.html
footprint IND-0402 (0402 (1005M) Inductor)
pins: 1, 2

## MLG1005SR10HT000
designator L?  Inductance: 100nH
Inductor, 100nH, ±3%, 1.37Ω, 200mA, SMD 0402; Manufacturer: TDK; Manufacturer Part Number: MLG1005SR10HT000; Self-Resonant Frequency: 900MHz; Q Factor: 8@100MHz; Package Size: 0402; JLCPCB Basic Part: No; JLCPCB Part Number: C433025; Supplier 1: LCSC; Category: Inductors; Supplier Part Number 1: C433025; Tolerance: ±3%; Rated Current: 200mA; DC Resistance: 1.37Ω; RoHS: Yes; ComponentLink1Description: Datasheet; ComponentLink1URL: https://wmsc.lcsc.com/wmsc/upload/file/pdf/v2/lcsc/1912111437_TDK-MLG1005SR10HT000_C433025.pdf; ComponentLink2Description: JLCPCB Part URL; ComponentLink2URL: https://jlcpcb.com/partdetail/C433025; ComponentLink3Description: LCSC Part URL; ComponentLink3URL: https://lcsc.com/product-detail/Inductors-SMD_TDK-TDK-MLG1005SR10HT000_C433025.html
footprint IND-0402 (0402 (1005M) Inductor)
pins: 1, 2

## MLG1005SR10JT000
designator L?  Inductance: 100nH
Inductor, 100nH, ±5%, 1.37Ω, 200mA, SMD 0402; Manufacturer: TDK; Manufacturer Part Number: MLG1005SR10JT000; Self-Resonant Frequency: 700MHz; Q Factor: 8@100MHz; Package Size: 0402; JLCPCB Basic Part: No; JLCPCB Part Number: C76779; Supplier 1: LCSC; Category: Inductors; Supplier Part Number 1: C76779; Tolerance: ±5%; Rated Current: 200mA; DC Resistance: 1.37Ω; RoHS: Yes; ComponentLink1Description: Datasheet; ComponentLink1URL: https://wmsc.lcsc.com/wmsc/upload/file/pdf/v2/lcsc/2304140030_TDK-MLG1005SR10JT000_C76779.pdf; ComponentLink2Description: JLCPCB Part URL; ComponentLink2URL: https://jlcpcb.com/partdetail/C76779; ComponentLink3Description: LCSC Part URL; ComponentLink3URL: https://lcsc.com/product-detail/Inductors-SMD_TDK-TDK-MLG1005SR10JT000_C76779.html
footprint IND-0402 (0402 (1005M) Inductor)
pins: 1, 2

## MLG1005SR10JTD25
designator L?  Inductance: 100nH
Inductor, 100nH, ±5%, 1.37Ω, 200mA, SMD 0402; Manufacturer: TDK; Manufacturer Part Number: MLG1005SR10JTD25; Self-Resonant Frequency: 700MHz; Q Factor: 8@100MHz; Package Size: 0402; JLCPCB Basic Part: No; JLCPCB Part Number: C307731; Supplier 1: LCSC; Category: Inductors; Supplier Part Number 1: C307731; Tolerance: ±5%; Rated Current: 200mA; DC Resistance: 1.37Ω; RoHS: Yes; ComponentLink1Description: Datasheet; ComponentLink1URL: https://wmsc.lcsc.com/wmsc/upload/file/pdf/v2/lcsc/2401221239_TDK-MLG1005SR10JTD25_C307731.pdf; ComponentLink2Description: JLCPCB Part URL; ComponentLink2URL: https://jlcpcb.com/partdetail/C307731; ComponentLink3Description: LCSC Part URL; ComponentLink3URL: https://lcsc.com/product-detail/Inductors-SMD_TDK-TDK-MLG1005SR10JTD25_C307731.html
footprint IND-0402 (0402 (1005M) Inductor)
pins: 1, 2

## MLG1005SR12HTD25
designator L?  Inductance: 120nH
Inductor, 120nH, ±3%, 1.48Ω, 150mA, SMD 0402; Manufacturer: TDK; Manufacturer Part Number: MLG1005SR12HTD25; Self-Resonant Frequency: 800MHz; Q Factor: 8@100MHz; Package Size: 0402; JLCPCB Basic Part: No; JLCPCB Part Number: C404658; Supplier 1: LCSC; Category: Inductors; Supplier Part Number 1: C404658; Tolerance: ±3%; Rated Current: 150mA; DC Resistance: 1.48Ω; RoHS: Yes; ComponentLink1Description: Datasheet; ComponentLink1URL: https://wmsc.lcsc.com/wmsc/upload/file/pdf/v2/lcsc/2304140030_TDK-MLG1005SR12HTD25_C404658.pdf; ComponentLink2Description: JLCPCB Part URL; ComponentLink2URL: https://jlcpcb.com/partdetail/C404658; ComponentLink3Description: LCSC Part URL; ComponentLink3URL: https://lcsc.com/product-detail/Inductors-SMD_TDK-TDK-MLG1005SR12HTD25_C404658.html
footprint IND-0402 (0402 (1005M) Inductor)
pins: 1, 2

## MLG1005SR12JT000
designator L?  Inductance: 120nH
Inductor, 120nH, ±5%, 1.48Ω, 150mA, SMD 0402; Manufacturer: TDK; Manufacturer Part Number: MLG1005SR12JT000; Self-Resonant Frequency: 600MHz; Q Factor: 8@100MHz; Package Size: 0402; JLCPCB Basic Part: No; JLCPCB Part Number: C76780; Supplier 1: LCSC; Category: Inductors; Supplier Part Number 1: C76780; Tolerance: ±5%; Rated Current: 150mA; DC Resistance: 1.48Ω; RoHS: Yes; ComponentLink1Description: Datasheet; ComponentLink1URL: https://wmsc.lcsc.com/wmsc/upload/file/pdf/v2/lcsc/2304140030_TDK-MLG1005SR12JT000_C76780.pdf; ComponentLink2Description: JLCPCB Part URL; ComponentLink2URL: https://jlcpcb.com/partdetail/C76780; ComponentLink3Description: LCSC Part URL; ComponentLink3URL: https://lcsc.com/product-detail/Inductors-SMD_TDK-TDK-MLG1005SR12JT000_C76780.html
footprint IND-0402 (0402 (1005M) Inductor)
pins: 1, 2

## MLG1005SR15HTD25
designator L?  Inductance: 150nH
Inductor, 150nH, ±3%, 2.44Ω, 150mA, SMD 0402; Manufacturer: TDK; Manufacturer Part Number: MLG1005SR15HTD25; Self-Resonant Frequency: 700MHz; Q Factor: 8@100MHz; Package Size: 0402; JLCPCB Basic Part: No; JLCPCB Part Number: C404660; Supplier 1: LCSC; Category: Inductors; Supplier Part Number 1: C404660; Tolerance: ±3%; Rated Current: 150mA; DC Resistance: 2.44Ω; RoHS: Yes; ComponentLink1Description: Datasheet; ComponentLink1URL: https://wmsc.lcsc.com/wmsc/upload/file/pdf/v2/lcsc/2304140030_TDK-MLG1005SR15HTD25_C404660.pdf; ComponentLink2Description: JLCPCB Part URL; ComponentLink2URL: https://jlcpcb.com/partdetail/C404660; ComponentLink3Description: LCSC Part URL; ComponentLink3URL: https://lcsc.com/product-detail/Inductors-SMD_TDK-TDK-MLG1005SR15HTD25_C404660.html
footprint IND-0402 (0402 (1005M) Inductor)
pins: 1, 2

## MLG1005SR15JT000
designator L?  Inductance: 150nH
Inductor, 150nH, ±5%, 2.44Ω, 150mA, SMD 0402; Manufacturer: TDK; Manufacturer Part Number: MLG1005SR15JT000; Self-Resonant Frequency: 550MHz; Q Factor: 8@100MHz; Package Size: 0402; JLCPCB Basic Part: No; JLCPCB Part Number: C76781; Supplier 1: LCSC; Category: Inductors; Supplier Part Number 1: C76781; Tolerance: ±5%; Rated Current: 150mA; DC Resistance: 2.44Ω; RoHS: Yes; ComponentLink1Description: Datasheet; ComponentLink1URL: https://wmsc.lcsc.com/wmsc/upload/file/pdf/v2/lcsc/2304140030_TDK-MLG1005SR15JT000_C76781.pdf; ComponentLink2Description: JLCPCB Part URL; ComponentLink2URL: https://jlcpcb.com/partdetail/C76781; ComponentLink3Description: LCSC Part URL; ComponentLink3URL: https://lcsc.com/product-detail/Inductors-SMD_TDK-TDK-MLG1005SR15JT000_C76781.html
footprint IND-0402 (0402 (1005M) Inductor)
pins: 1, 2

## MLG1005SR16JTD25
designator L?  Inductance: 160nH
Inductor, 160nH, ±5%, 2.74Ω, 150mA, SMD 0402; Manufacturer: TDK; Manufacturer Part Number: MLG1005SR16JTD25; Self-Resonant Frequency: 600MHz; Q Factor: 8@100MHz; Package Size: 0402; JLCPCB Basic Part: No; JLCPCB Part Number: C880696; Supplier 1: LCSC; Category: Inductors; Supplier Part Number 1: C880696; Tolerance: ±5%; Rated Current: 150mA; DC Resistance: 2.74Ω; RoHS: Yes; ComponentLink1Description: Datasheet; ComponentLink1URL: https://wmsc.lcsc.com/wmsc/upload/file/pdf/v2/lcsc/2304140030_TDK-MLG1005SR16JTD25_C880696.pdf; ComponentLink2Description: JLCPCB Part URL; ComponentLink2URL: https://jlcpcb.com/partdetail/C880696; ComponentLink3Description: LCSC Part URL; ComponentLink3URL: https://lcsc.com/product-detail/Inductors-SMD_TDK-TDK-MLG1005SR16JTD25_C880696.html
footprint IND-0402 (0402 (1005M) Inductor)
pins: 1, 2

## MLG1005SR18JT000
designator L?  Inductance: 180nH
Inductor, 180nH, ±5%, 2.88Ω, 150mA, SMD 0402; Manufacturer: TDK; Manufacturer Part Number: MLG1005SR18JT000; Self-Resonant Frequency: 500MHz; Q Factor: 8@100MHz; Package Size: 0402; JLCPCB Basic Part: No; JLCPCB Part Number: C76782; Supplier 1: LCSC; Category: Inductors; Supplier Part Number 1: C76782; Tolerance: ±5%; Rated Current: 150mA; DC Resistance: 2.88Ω; RoHS: Yes; ComponentLink1Description: Datasheet; ComponentLink1URL: https://wmsc.lcsc.com/wmsc/upload/file/pdf/v2/lcsc/2304140030_TDK-MLG1005SR18JT000_C76782.pdf; ComponentLink2Description: JLCPCB Part URL; ComponentLink2URL: https://jlcpcb.com/partdetail/C76782; ComponentLink3Description: LCSC Part URL; ComponentLink3URL: https://lcsc.com/product-detail/Inductors-SMD_TDK-TDK-MLG1005SR18JT000_C76782.html
footprint IND-0402 (0402 (1005M) Inductor)
pins: 1, 2

## MLG1005SR18JTD25
designator L?  Inductance: 180nH
Inductor, 180nH, ±5%, 2.88Ω, 150mA, SMD 0402; Manufacturer: TDK; Manufacturer Part Number: MLG1005SR18JTD25; Self-Resonant Frequency: 500MHz; Q Factor: 8@100MHz; Package Size: 0402; JLCPCB Basic Part: No; JLCPCB Part Number: C694570; Supplier 1: LCSC; Category: Inductors; Supplier Part Number 1: C694570; Tolerance: ±5%; Rated Current: 150mA; DC Resistance: 2.88Ω; RoHS: Yes; ComponentLink1Description: Datasheet; ComponentLink1URL: https://wmsc.lcsc.com/wmsc/upload/file/pdf/v2/lcsc/2304140030_TDK-MLG1005SR18JTD25_C694570.pdf; ComponentLink2Description: JLCPCB Part URL; ComponentLink2URL: https://jlcpcb.com/partdetail/C694570; ComponentLink3Description: LCSC Part URL; ComponentLink3URL: https://lcsc.com/product-detail/Inductors-SMD_TDK-TDK-MLG1005SR18JTD25_C694570.html
footprint IND-0402 (0402 (1005M) Inductor)
pins: 1, 2

## MLG1005SR22HT000
designator L?  Inductance: 220nH
Inductor, 220nH, ±3%, 3.02Ω, 100mA, SMD 0402; Manufacturer: TDK; Manufacturer Part Number: MLG1005SR22HT000; Self-Resonant Frequency: 500MHz; Q Factor: 8@100MHz; Package Size: 0402; JLCPCB Basic Part: No; JLCPCB Part Number: C275307; Supplier 1: LCSC; Category: Inductors; Supplier Part Number 1: C275307; Tolerance: ±3%; Rated Current: 100mA; DC Resistance: 3.02Ω; RoHS: Yes; ComponentLink1Description: Datasheet; ComponentLink1URL: https://wmsc.lcsc.com/wmsc/upload/file/pdf/v2/lcsc/2304140030_TDK-MLG1005SR22HT000_C275307.pdf; ComponentLink2Description: JLCPCB Part URL; ComponentLink2URL: https://jlcpcb.com/partdetail/C275307; ComponentLink3Description: LCSC Part URL; ComponentLink3URL: https://lcsc.com/product-detail/Inductors-SMD_TDK-TDK-MLG1005SR22HT000_C275307.html
footprint IND-0402 (0402 (1005M) Inductor)
pins: 1, 2

## MLG1005SR22JT000
designator L?  Inductance: 220nH
Inductor, 220nH, ±5%, 3.02Ω, 100mA, SMD 0402; Manufacturer: TDK; Manufacturer Part Number: MLG1005SR22JT000; Self-Resonant Frequency: 450MHz; Q Factor: 8@100MHz; Package Size: 0402; JLCPCB Basic Part: No; JLCPCB Part Number: C76783; Supplier 1: LCSC; Category: Inductors; Supplier Part Number 1: C76783; Tolerance: ±5%; Rated Current: 100mA; DC Resistance: 3.02Ω; RoHS: Yes; ComponentLink1Description: Datasheet; ComponentLink1URL: https://wmsc.lcsc.com/wmsc/upload/file/pdf/v2/lcsc/2304140030_TDK-MLG1005SR22JT000_C76783.pdf; ComponentLink2Description: JLCPCB Part URL; ComponentLink2URL: https://jlcpcb.com/partdetail/C76783; ComponentLink3Description: LCSC Part URL; ComponentLink3URL: https://lcsc.com/product-detail/Inductors-SMD_TDK-TDK-MLG1005SR22JT000_C76783.html
footprint IND-0402 (0402 (1005M) Inductor)
pins: 1, 2
